# Altium footprint library Package_DFN_QFN.PcbLib: 557 footprints (part 6 of 35)
Each footprint in its own frame and in the unit in brackets; x right, y up, seen from the top. Pads: shape width x height; smd on the part's side, far side on the other; paste and mask are expansions set on the pad; w line width, h text height; cw(c..) or ccw(c..) is an arc to the next point about the centre after c.
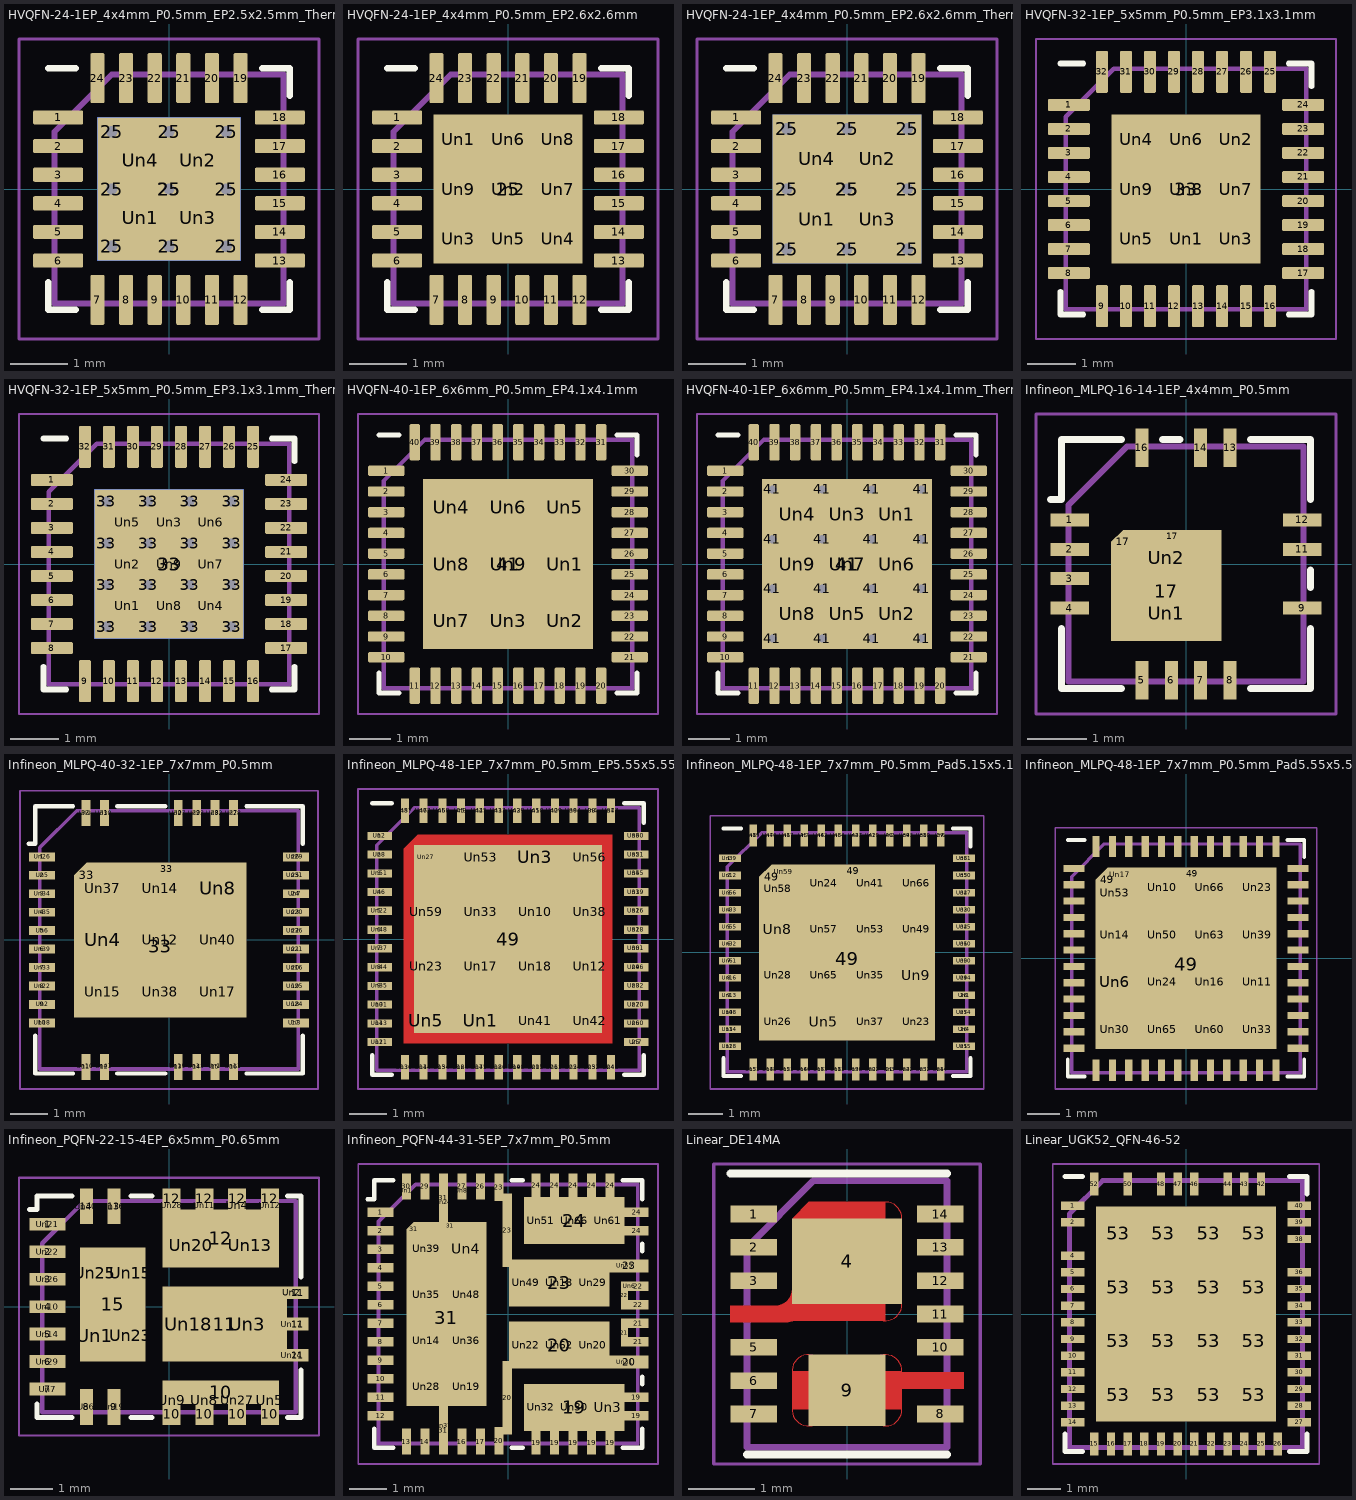
[diagram p5: the footprints below, top view; thin cyan lines are the x and y axes]

## HVQFN-24-1EP_4x4mm_P0.5mm_EP2.5x2.5mm_ThermalVias [mm]
pads (39):
  rrect25% 0.875x0.25 smd: 1(-1.937,1.25) 2(-1.937,0.75) 3(-1.937,0.25) 4(-1.937,-0.25) 5(-1.937,-0.75) 6(-1.937,-1.25) 13(1.937,-1.25) 14(1.937,-0.75) 15(1.937,-0.25) 16(1.937,0.25) 17(1.937,0.75) 18(1.937,1.25)
  rrect25% 0.25x0.875 smd: 7(-1.25,-1.937) 8(-0.75,-1.937) 9(-0.25,-1.937) 10(0.25,-1.937) 11(0.75,-1.937) 12(1.25,-1.937) 19(1.25,1.937) 20(0.75,1.937) 21(0.25,1.937) 22(-0.25,1.937) 23(-0.75,1.937) 24(-1.25,1.937)
  round 0.5 hole 0.2: 25(-1,-1) 25(-1,0) 25(-1,1) 25(0,-1) 25(0,0) 25(0,1) 25(1,-1) 25(1,0) 25(1,1)
  rect 2.5x2.5 smd far side: 25(0,0)
  rect 2.5x2.5 smd: 25(0,0)
  round 0.779 on Top Paste: Un1(-0.5,-0.5) Un2(0.5,0.5) Un3(0.5,-0.5) Un4(-0.5,0.5)
F.SilkS:
  lines w0.12: -2.11,-1.635 -2.11,-2.11 -1.635,-2.11 ; -2.11,2.11 -1.635,2.11 ; 1.635,-2.11 2.11,-2.11 2.11,-1.635 ; 1.635,2.11 2.11,2.11 2.11,1.635
F.Paste:
  region: -0.185,-0.308 -0.185,-0.692 -0.308,-0.815 -0.692,-0.815 -0.815,-0.692 -0.815,-0.308 -0.692,-0.185 -0.308,-0.185
  region: 0.815,0.692 0.815,0.308 0.692,0.185 0.308,0.185 0.185,0.308 0.185,0.692 0.308,0.815 0.692,0.815
  region: 0.815,-0.308 0.815,-0.692 0.692,-0.815 0.308,-0.815 0.185,-0.692 0.185,-0.308 0.308,-0.185 0.692,-0.185
  region: -0.185,0.692 -0.185,0.308 -0.308,0.185 -0.692,0.185 -0.815,0.308 -0.815,0.692 -0.692,0.815 -0.308,0.815
F.CrtYd:
  lines w0.05: -2.62,-2.62 2.62,-2.62 2.62,2.62 -2.62,2.62 -2.62,-2.62
F.Fab:
  lines w0.1: -2,-2 2,-2 2,2 -1,2 -2,1 -2,-2
  text "'.Designator'" at -4.047,-0.84 h1

## HVQFN-24-1EP_4x4mm_P0.5mm_EP2.6x2.6mm [mm]
pads (34):
  rrect25% 0.875x0.25 smd: 1(-1.937,1.25) 2(-1.937,0.75) 3(-1.937,0.25) 4(-1.937,-0.25) 5(-1.937,-0.75) 6(-1.937,-1.25) 13(1.937,-1.25) 14(1.937,-0.75) 15(1.937,-0.25) 16(1.937,0.25) 17(1.937,0.75) 18(1.937,1.25)
  rrect25% 0.25x0.875 smd: 7(-1.25,-1.937) 8(-0.75,-1.937) 9(-0.25,-1.937) 10(0.25,-1.937) 11(0.75,-1.937) 12(1.25,-1.937) 19(1.25,1.937) 20(0.75,1.937) 21(0.25,1.937) 22(-0.25,1.937) 23(-0.75,1.937) 24(-1.25,1.937)
  rect 2.6x2.6 smd: 25(0,0)
  rrect25% 0.7x0.7 on Top Paste: Un1(-0.87,0.87) Un2(0,0) Un3(-0.87,-0.87) Un4(0.87,-0.87) Un5(0,-0.87) Un6(0,0.87) Un7(0.87,0) Un8(0.87,0.87) Un9(-0.87,0)
F.SilkS:
  lines w0.12: -2.11,-1.635 -2.11,-2.11 -1.635,-2.11 ; -2.11,2.11 -1.635,2.11 ; 1.635,-2.11 2.11,-2.11 2.11,-1.635 ; 1.635,2.11 2.11,2.11 2.11,1.635
F.CrtYd:
  lines w0.05: -2.62,-2.62 2.62,-2.62 2.62,2.62 -2.62,2.62 -2.62,-2.62
F.Fab:
  lines w0.1: -2,-2 2,-2 2,2 -1,2 -2,1 -2,-2
  text "'.Designator'" at -4.047,-0.84 h1

## HVQFN-24-1EP_4x4mm_P0.5mm_EP2.6x2.6mm_ThermalVias [mm]
pads (39):
  rrect25% 0.875x0.25 smd: 1(-1.937,1.25) 2(-1.937,0.75) 3(-1.937,0.25) 4(-1.937,-0.25) 5(-1.937,-0.75) 6(-1.937,-1.25) 13(1.937,-1.25) 14(1.937,-0.75) 15(1.937,-0.25) 16(1.937,0.25) 17(1.937,0.75) 18(1.937,1.25)
  rrect25% 0.25x0.875 smd: 7(-1.25,-1.937) 8(-0.75,-1.937) 9(-0.25,-1.937) 10(0.25,-1.937) 11(0.75,-1.937) 12(1.25,-1.937) 19(1.25,1.937) 20(0.75,1.937) 21(0.25,1.937) 22(-0.25,1.937) 23(-0.75,1.937) 24(-1.25,1.937)
  round 0.5 hole 0.2: 25(-1.05,-1.05) 25(-1.05,0) 25(-1.05,1.05) 25(0,-1.05) 25(0,0) 25(0,1.05) 25(1.05,-1.05) 25(1.05,0) 25(1.05,1.05)
  rect 2.6x2.6 smd: 25(0,0)
  rect 2.6x2.6 smd far side: 25(0,0)
  round 0.825 on Top Paste: Un1(-0.525,-0.525) Un2(0.525,0.525) Un3(0.525,-0.525) Un4(-0.525,0.525)
F.SilkS:
  lines w0.12: -2.11,-1.635 -2.11,-2.11 -1.635,-2.11 ; -2.11,2.11 -1.635,2.11 ; 1.635,-2.11 2.11,-2.11 2.11,-1.635 ; 1.635,2.11 2.11,2.11 2.11,1.635
F.Paste:
  region: -0.182,-0.298 -0.182,-0.752 -0.298,-0.868 -0.752,-0.868 -0.868,-0.752 -0.868,-0.298 -0.752,-0.182 -0.298,-0.182
  region: 0.868,0.752 0.868,0.298 0.752,0.182 0.298,0.182 0.182,0.298 0.182,0.752 0.298,0.868 0.752,0.868
  region: 0.868,-0.298 0.868,-0.752 0.752,-0.868 0.298,-0.868 0.182,-0.752 0.182,-0.298 0.298,-0.182 0.752,-0.182
  region: -0.182,0.752 -0.182,0.298 -0.298,0.182 -0.752,0.182 -0.868,0.298 -0.868,0.752 -0.752,0.868 -0.298,0.868
F.CrtYd:
  lines w0.05: -2.62,-2.62 -2.62,2.62 2.62,2.62 2.62,-2.62 -2.62,-2.62
F.Fab:
  lines w0.1: -2,-2 2,-2 2,2 -1,2 -2,1 -2,-2
  text "'.Designator'" at -4.047,-0.84 h1

## HVQFN-32-1EP_5x5mm_P0.5mm_EP3.1x3.1mm [mm]
pads (42):
  rrect25% 0.875x0.25 smd: 1(-2.438,1.75) 2(-2.438,1.25) 3(-2.438,0.75) 4(-2.438,0.25) 5(-2.438,-0.25) 6(-2.438,-0.75) 7(-2.438,-1.25) 8(-2.438,-1.75) 17(2.438,-1.75) 18(2.438,-1.25) 19(2.438,-0.75) 20(2.438,-0.25) 21(2.438,0.25) 22(2.438,0.75) 23(2.438,1.25) 24(2.438,1.75)
  rrect25% 0.25x0.875 smd: 9(-1.75,-2.438) 10(-1.25,-2.438) 11(-0.75,-2.438) 12(-0.25,-2.438) 13(0.25,-2.438) 14(0.75,-2.438) 15(1.25,-2.438) 16(1.75,-2.438) 25(1.75,2.438) 26(1.25,2.438) 27(0.75,2.438) 28(0.25,2.438) 29(-0.25,2.438) 30(-0.75,2.438) 31(-1.25,2.438) 32(-1.75,2.438)
  rect 3.1x3.1 smd: 33(0,0)
  rrect25% 0.83x0.83 on Top Paste: Un1(0,-1.03) Un2(1.03,1.03) Un3(1.03,-1.03) Un4(-1.03,1.03) Un5(-1.03,-1.03) Un6(0,1.03) Un7(1.03,0) Un8(0,0) Un9(-1.03,0)
F.SilkS:
  lines w0.12: -2.61,-2.135 -2.61,-2.61 -2.135,-2.61 ; -2.61,2.61 -2.135,2.61 ; 2.135,-2.61 2.61,-2.61 2.61,-2.135 ; 2.135,2.61 2.61,2.61 2.61,2.135
F.CrtYd:
  lines w0.05: -3.12,-3.12 3.12,-3.12 3.12,3.12 -3.12,3.12 -3.12,-3.12
F.Fab:
  lines w0.1: -2.5,-2.5 2.5,-2.5 2.5,2.5 -1.5,2.5 -2.5,1.5 -2.5,-2.5
  text "'.Designator'" at -4.047,-0.84 h1

## HVQFN-32-1EP_5x5mm_P0.5mm_EP3.1x3.1mm_ThermalVias [mm]
pads (59):
  rrect25% 0.875x0.25 smd: 1(-2.438,1.75) 2(-2.438,1.25) 3(-2.438,0.75) 4(-2.438,0.25) 5(-2.438,-0.25) 6(-2.438,-0.75) 7(-2.438,-1.25) 8(-2.438,-1.75) 17(2.438,-1.75) 18(2.438,-1.25) 19(2.438,-0.75) 20(2.438,-0.25) 21(2.438,0.25) 22(2.438,0.75) 23(2.438,1.25) 24(2.438,1.75)
  rrect25% 0.25x0.875 smd: 9(-1.75,-2.438) 10(-1.25,-2.438) 11(-0.75,-2.438) 12(-0.25,-2.438) 13(0.25,-2.438) 14(0.75,-2.438) 15(1.25,-2.438) 16(1.75,-2.438) 25(1.75,2.438) 26(1.25,2.438) 27(0.75,2.438) 28(0.25,2.438) 29(-0.25,2.438) 30(-0.75,2.438) 31(-1.25,2.438) 32(-1.75,2.438)
  round 0.5 hole 0.2: 33(-1.3,-1.3) 33(-1.3,-0.433) 33(-1.3,0.433) 33(-1.3,1.3) 33(-0.433,-1.3) 33(-0.433,-0.433) 33(-0.433,0.433) 33(-0.433,1.3) 33(0.433,-1.3) 33(0.433,-0.433) 33(0.433,0.433) 33(0.433,1.3) 33(1.3,-1.3) 33(1.3,-0.433) 33(1.3,0.433) 33(1.3,1.3)
  rect 3.1x3.1 smd far side: 33(0,0)
  rect 3.1x3.1 smd: 33(0,0)
  round 0.637 on Top Paste: Un1(-0.867,-0.867) Un2(-0.867,0) Un3(0,0.867) Un4(0.867,-0.867) Un5(-0.867,0.867) Un6(0.867,0.867) Un7(0.867,0) Un8(0,-0.867) Un9(0,0)
F.SilkS:
  lines w0.12: -2.61,-2.135 -2.61,-2.61 -2.135,-2.61 ; -2.61,2.61 -2.135,2.61 ; 2.135,-2.61 2.61,-2.61 2.61,-2.135 ; 2.135,2.61 2.61,2.61 2.61,2.135
F.Paste:
  region: -0.613,-0.719 -0.613,-1.014 -0.719,-1.121 -1.014,-1.121 -1.121,-1.014 -1.121,-0.719 -1.014,-0.613 -0.719,-0.613
  region: -0.613,0.147 -0.613,-0.147 -0.719,-0.254 -1.014,-0.254 -1.121,-0.147 -1.121,0.147 -1.014,0.254 -0.719,0.254
  region: 0.254,1.014 0.254,0.719 0.147,0.613 -0.147,0.613 -0.254,0.719 -0.254,1.014 -0.147,1.121 0.147,1.121
  region: 1.121,-0.719 1.121,-1.014 1.014,-1.121 0.719,-1.121 0.613,-1.014 0.613,-0.719 0.719,-0.613 1.014,-0.613
  region: -0.613,1.014 -0.613,0.719 -0.719,0.613 -1.014,0.613 -1.121,0.719 -1.121,1.014 -1.014,1.121 -0.719,1.121
  region: 1.121,1.014 1.121,0.719 1.014,0.613 0.719,0.613 0.613,0.719 0.613,1.014 0.719,1.121 1.014,1.121
  region: 1.121,0.147 1.121,-0.147 1.014,-0.254 0.719,-0.254 0.613,-0.147 0.613,0.147 0.719,0.254 1.014,0.254
  region: 0.254,-0.719 0.254,-1.014 0.147,-1.121 -0.147,-1.121 -0.254,-1.014 -0.254,-0.719 -0.147,-0.613 0.147,-0.613
  region: 0.254,0.147 0.254,-0.147 0.147,-0.254 -0.147,-0.254 -0.254,-0.147 -0.254,0.147 -0.147,0.254 0.147,0.254
F.CrtYd:
  lines w0.05: -3.12,-3.12 3.12,-3.12 3.12,3.12 -3.12,3.12 -3.12,-3.12
F.Fab:
  lines w0.1: -2.5,-2.5 -2.5,1.5 -1.5,2.5 2.5,2.5 2.5,-2.5 -2.5,-2.5
  text "'.Designator'" at -4.047,-0.84 h1

## HVQFN-40-1EP_6x6mm_P0.5mm_EP4.1x4.1mm [mm]
pads (50):
  rrect25% 0.875x0.25 smd: 1(-2.937,2.25) 2(-2.937,1.75) 3(-2.937,1.25) 4(-2.937,0.75) 5(-2.937,0.25) 6(-2.937,-0.25) 7(-2.937,-0.75) 8(-2.937,-1.25) 9(-2.937,-1.75) 10(-2.937,-2.25) 21(2.937,-2.25) 22(2.937,-1.75) 23(2.937,-1.25) 24(2.937,-0.75) 25(2.937,-0.25) 26(2.937,0.25) 27(2.937,0.75) 28(2.937,1.25) 29(2.937,1.75) 30(2.937,2.25)
  rrect25% 0.25x0.875 smd: 11(-2.25,-2.937) 12(-1.75,-2.937) 13(-1.25,-2.937) 14(-0.75,-2.937) 15(-0.25,-2.937) 16(0.25,-2.937) 17(0.75,-2.937) 18(1.25,-2.937) 19(1.75,-2.937) 20(2.25,-2.937) 31(2.25,2.937) 32(1.75,2.937) 33(1.25,2.937) 34(0.75,2.937) 35(0.25,2.937) 36(-0.25,2.937) 37(-0.75,2.937) 38(-1.25,2.937) 39(-1.75,2.937) 40(-2.25,2.937)
  rect 4.1x4.1 smd: 41(0,0)
  rrect23% 1.1x1.1 on Top Paste: Un1(1.37,0) Un2(1.37,-1.37) Un3(0,-1.37) Un4(-1.37,1.37) Un5(1.37,1.37) Un6(0,1.37) Un7(-1.37,-1.37) Un8(-1.37,0) Un9(0,0)
F.SilkS:
  lines w0.12: -3.11,-2.635 -3.11,-3.11 -2.635,-3.11 ; -3.11,3.11 -2.635,3.11 ; 2.635,-3.11 3.11,-3.11 3.11,-2.635 ; 2.635,3.11 3.11,3.11 3.11,2.635
F.CrtYd:
  lines w0.05: -3.62,-3.62 -3.62,3.62 3.62,3.62 3.62,-3.62 -3.62,-3.62
F.Fab:
  lines w0.1: -3,-3 3,-3 3,3 -2,3 -3,2 -3,-3
  text "'.Designator'" at -4.047,-0.84 h1

## HVQFN-40-1EP_6x6mm_P0.5mm_EP4.1x4.1mm_ThermalVias [mm]
pads (67):
  rrect25% 0.875x0.25 smd: 1(-2.937,2.25) 2(-2.937,1.75) 3(-2.937,1.25) 4(-2.937,0.75) 5(-2.937,0.25) 6(-2.937,-0.25) 7(-2.937,-0.75) 8(-2.937,-1.25) 9(-2.937,-1.75) 10(-2.937,-2.25) 21(2.937,-2.25) 22(2.937,-1.75) 23(2.937,-1.25) 24(2.937,-0.75) 25(2.937,-0.25) 26(2.937,0.25) 27(2.937,0.75) 28(2.937,1.25) 29(2.937,1.75) 30(2.937,2.25)
  rrect25% 0.25x0.875 smd: 11(-2.25,-2.937) 12(-1.75,-2.937) 13(-1.25,-2.937) 14(-0.75,-2.937) 15(-0.25,-2.937) 16(0.25,-2.937) 17(0.75,-2.937) 18(1.25,-2.937) 19(1.75,-2.937) 20(2.25,-2.937) 31(2.25,2.937) 32(1.75,2.937) 33(1.25,2.937) 34(0.75,2.937) 35(0.25,2.937) 36(-0.25,2.937) 37(-0.75,2.937) 38(-1.25,2.937) 39(-1.75,2.937) 40(-2.25,2.937)
  round 0.5 hole 0.2: 41(-1.8,-1.8) 41(-1.8,-0.6) 41(-1.8,0.6) 41(-1.8,1.8) 41(-0.6,-1.8) 41(-0.6,-0.6) 41(-0.6,0.6) 41(-0.6,1.8) 41(0.6,-1.8) 41(0.6,-0.6) 41(0.6,0.6) 41(0.6,1.8) 41(1.8,-1.8) 41(1.8,-0.6) 41(1.8,0.6) 41(1.8,1.8)
  rect 4.1x4.1 smd: 41(0,0)
  rect 4.1x4.1 smd far side: 41(0,0)
  rrect24% 1.059x1.059 on Top Paste: Un1(1.2,1.2) Un2(1.2,-1.2) Un3(0,1.2) Un4(-1.2,1.2) Un5(0,-1.2) Un6(1.2,0) Un7(0,0) Un8(-1.2,-1.2) Un9(-1.2,0)
F.SilkS:
  lines w0.12: -3.11,-2.635 -3.11,-3.11 -2.635,-3.11 ; -3.11,3.11 -2.635,3.11 ; 2.635,-3.11 3.11,-3.11 3.11,-2.635 ; 2.635,3.11 3.11,3.11 3.11,2.635
F.CrtYd:
  lines w0.05: -3.62,-3.62 -3.62,3.62 3.62,3.62 3.62,-3.62 -3.62,-3.62
F.Fab:
  lines w0.1: -3,-3 3,-3 3,3 -2,3 -3,2 -3,-3
  text "'.Designator'" at -4.047,-0.84 h1

## Infineon_MLPQ-16-14-1EP_4x4mm_P0.5mm [mm]
pads (19):
  rect 0.65x0.22 smd: 1(-1.975,0.75) 2(-1.975,0.25) 3(-1.975,-0.25) 4(-1.975,-0.75) 9(1.975,-0.75) 11(1.975,0.25) 12(1.975,0.75)
  rect 0.22x0.65 smd: 5(-0.75,-1.975) 6(-0.25,-1.975) 7(0.25,-1.975) 8(0.75,-1.975) 13(0.75,1.975) 14(0.25,1.975) 16(-0.75,1.975)
  rect 0.283x0.283 smd rot 45: 17(-1.075,0.375)
  rect 1.88x1.68 smd: 17(-0.335,-0.465)
  rect 1.68x0.2 smd: 17(-0.235,0.475)
  rect 1.5x0.8 on Top Paste: Un1(-0.335,-0.835) Un2(-0.335,0.105)
F.SilkS:
  lines w0.12: -2.3,1.1 -2.12,1.1 -2.12,2.12 -1.1,2.12 ; -2.12,-1.1 -2.12,-2.12 -1.1,-2.12 ; -0.4,2.12 -0.1,2.12 ; 1.1,-2.12 2.12,-2.12 2.12,-1.1 ; 1.1,2.12 2.12,2.12 2.12,1.1 ; 2.12,-0.4 2.12,-0.1
F.CrtYd:
  lines w0.05: -2.55,-2.55 -2.55,2.55 2.55,2.55 2.55,-2.55 -2.55,-2.55
F.Fab:
  lines w0.1: -2,-2 2,-2 2,2 -1,2 -2,1 -2,-2
  text "'.Designator'" at -3.657,-0.771 h0.9

## Infineon_MLPQ-40-32-1EP_7x7mm_P0.5mm [mm]
pads (76):
  rect 0.7x0.24 smd: 1(-3.44,2.25) 2(-3.44,1.75) 3(-3.44,1.25) 4(-3.44,0.75) 5(-3.44,0.25) 6(-3.44,-0.25) 7(-3.44,-0.75) 8(-3.44,-1.25) 9(-3.44,-1.75) 10(-3.44,-2.25) 17(3.44,-2.25) 18(3.44,-1.75) 19(3.44,-1.25) 20(3.44,-0.75) 21(3.44,-0.25) 22(3.44,0.25) 23(3.44,0.75) 24(3.44,1.25) 25(3.44,1.75) 26(3.44,2.25)
  rect 0.24x0.7 smd: 11(-2.25,-3.44) 12(-1.75,-3.44) 13(0.25,-3.44) 14(0.75,-3.44) 15(1.25,-3.44) 16(1.75,-3.44) 27(1.75,3.44) 28(1.25,3.44) 29(0.75,3.44) 30(0.25,3.44) 31(-1.75,3.44) 32(-2.25,3.44)
  rect 0.495x0.495 smd rot 45: 33(-2.225,1.75)
  rect 4.675x3.85 smd: 33(-0.238,-0.175)
  rect 4.325x0.35 smd: 33(-0.062,1.925)
  rect 0.22x0.65 on Top Paste: Un1(1.25,-3.425) Un9(-2.25,3.425) Un10(-2.25,-3.425) Un11(1.75,-3.425) Un13(0.75,-3.425) Un19(0.25,-3.425) Un23(0.75,3.425) Un27(0.25,3.425) Un28(1.75,3.425) Un30(-1.75,3.425) Un32(1.25,3.425) Un41(-1.75,-3.425)
  rect 0.65x0.22 on Top Paste: Un2(-3.425,-1.75) Un3(3.425,-2.25) Un5(-3.425,1.75) Un6(-3.425,0.25) Un7(3.425,1.25) Un16(3.425,-0.75) Un18(-3.425,-2.25) Un20(3.425,0.75) Un21(3.425,-0.25) Un22(-3.425,-1.25) Un24(3.425,-1.75) Un25(3.425,-1.25) Un26(-3.425,2.25) Un29(3.425,2.25) Un31(3.425,1.75) Un33(-3.425,-0.75) Un34(-3.425,1.25) Un35(-3.425,0.75) Un36(3.425,0.25) Un39(-3.425,-0.25)
  rect 1.2x1.1 on Top Paste: Un4(-1.796,0) Un8(1.321,1.4) Un12(-0.238,0) Un14(-0.238,1.4) Un15(-1.796,-1.4) Un17(1.321,-1.4) Un37(-1.796,1.4) Un38(-0.238,-1.4) Un40(1.321,0)
F.SilkS:
  lines w0.12: -3.8,2.6 -3.62,2.6 -3.62,3.62 -2.6,3.62 ; -3.62,-2.6 -3.62,-3.62 -2.6,-3.62 ; -1.4,-3.62 -0.1,-3.62 ; -1.4,3.62 -0.1,3.62 ; 2.1,-3.62 3.62,-3.62 3.62,-2.6 ; 2.1,3.62 3.62,3.62 3.62,2.6
F.CrtYd:
  lines w0.05: -4.04,-4.04 4.04,-4.04 4.04,4.04 -4.04,4.04 -4.04,-4.04
F.Fab:
  lines w0.1: -3.5,-3.5 -3.5,2.5 -2.5,3.5 3.5,3.5 3.5,-3.5 -3.5,-3.5
  text "'.Designator'" at -4.047,-0.84 h1

## Infineon_MLPQ-48-1EP_7x7mm_P0.5mm_EP5.55x5.55mm [mm]
pads (113):
  rect 0.65x0.22 smd: 1(-3.425,2.75) 2(-3.425,2.25) 3(-3.425,1.75) 4(-3.425,1.25) 5(-3.425,0.75) 6(-3.425,0.25) 7(-3.425,-0.25) 8(-3.425,-0.75) 9(-3.425,-1.25) 10(-3.425,-1.75) 11(-3.425,-2.25) 12(-3.425,-2.75) 25(3.425,-2.75) 26(3.425,-2.25) 27(3.425,-1.75) 28(3.425,-1.25) 29(3.425,-0.75) 30(3.425,-0.25) 31(3.425,0.25) 32(3.425,0.75) 33(3.425,1.25) 34(3.425,1.75) 35(3.425,2.25) 36(3.425,2.75)
  rect 0.22x0.65 smd: 13(-2.75,-3.425) 14(-2.25,-3.425) 15(-1.75,-3.425) 16(-1.25,-3.425) 17(-0.75,-3.425) 18(-0.25,-3.425) 19(0.25,-3.425) 20(0.75,-3.425) 21(1.25,-3.425) 22(1.75,-3.425) 23(2.25,-3.425) 24(2.75,-3.425) 37(2.75,3.425) 38(2.25,3.425) 39(1.75,3.425) 40(1.25,3.425) 41(0.75,3.425) 42(0.25,3.425) 43(-0.25,3.425) 44(-0.75,3.425) 45(-1.25,3.425) 46(-1.75,3.425) 47(-2.25,3.425) 48(-2.75,3.425)
  rect 5x5 smd: 49(0,0)
  rect 1.1x1.1 on Top Paste: Un1(-0.725,-2.175) Un3(0.725,2.175) Un5(-2.175,-2.175) Un10(0.725,0.725) Un12(2.175,-0.725) Un17(-0.725,-0.725) Un18(0.725,-0.725) Un23(-2.175,-0.725) Un33(-0.725,0.725) Un38(2.175,0.725) Un41(0.725,-2.175) Un42(2.175,-2.175) Un53(-0.725,2.175) Un56(2.175,2.175) Un59(-2.175,0.725)
  rect 0.55x0.22 on Top Paste: Un2(-3.425,2.75) Un6(-3.425,1.25) Un7(3.425,-2.75) Un8(-3.425,2.25) Un11(-3.425,-2.75) Un16(3.425,0.75) Un19(3.425,1.25) Un20(3.425,-1.75) Un21(3.425,2.25) Un22(-3.425,0.75) Un28(3.425,0.25) Un30(3.425,2.75) Un31(-3.425,-1.75) Un32(3.425,-1.25) Un35(-3.425,-1.25) Un37(-3.425,-0.25) Un43(-3.425,-2.25) Un44(-3.425,-0.75) Un46(3.425,-0.75) Un48(-3.425,0.25) Un51(-3.425,1.75) Un55(3.425,1.75) Un60(3.425,-2.25) Un61(3.425,-0.25)
  rect 0.22x0.55 on Top Paste: Un4(2.25,3.425) Un9(-1.25,3.425) Un13(-0.25,3.425) Un14(-2.25,-3.425) Un15(0.75,-3.425) Un24(-1.25,-3.425) Un25(-0.75,3.425) Un26(-0.25,-3.425) Un29(1.25,3.425) Un34(-1.75,-3.425) Un36(-2.75,-3.425) Un39(0.25,3.425) Un40(0.25,-3.425) Un45(-0.75,-3.425) Un47(2.75,3.425) Un49(2.75,-3.425) Un50(0.75,3.425) Un52(2.25,-3.425) Un54(1.75,-3.425) Un57(-2.75,3.425) Un58(-1.75,3.425) Un62(-2.25,3.425) Un63(1.25,-3.425) Un64(1.75,3.425)
  rect 0.5x0.5 on Top Paste: Un27(-2.175,2.175)
F.Cu:
  region: 2.775,-2.775 -2.775,-2.775 -2.775,2.407 -2.407,2.775 2.775,2.775
F.SilkS:
  lines w0.12: -3.62,-3.1 -3.62,-3.62 -3.1,-3.62 ; -3.62,3.62 -3.1,3.62 ; 3.1,-3.62 3.62,-3.62 3.62,-3.1 ; 3.1,3.62 3.62,3.62 3.62,3.1
F.Paste:
  region: -1.625,1.625 -2.725,1.625 -2.725,2.386 -2.386,2.725 -1.625,2.725
F.Mask:
  region: 2.775,-2.775 -2.775,-2.775 -2.775,2.407 -2.407,2.775 2.775,2.775
F.CrtYd:
  lines w0.05: -4,-4 4,-4 4,4 -4,4 -4,-4
F.Fab:
  lines w0.1: -3.5,-3.5 -3.5,2.5 -2.5,3.5 3.5,3.5 3.5,-3.5 -3.5,-3.5
  text "'.Designator'" at -4.047,-0.84 h1

## Infineon_MLPQ-48-1EP_7x7mm_P0.5mm_Pad5.15x5.15mm [mm]
pads (117):
  rect 0.65x0.22 smd: 1(-3.425,2.75) 2(-3.425,2.25) 3(-3.425,1.75) 4(-3.425,1.25) 5(-3.425,0.75) 6(-3.425,0.25) 7(-3.425,-0.25) 8(-3.425,-0.75) 9(-3.425,-1.25) 10(-3.425,-1.75) 11(-3.425,-2.25) 12(-3.425,-2.75) 25(3.425,-2.75) 26(3.425,-2.25) 27(3.425,-1.75) 28(3.425,-1.25) 29(3.425,-0.75) 30(3.425,-0.25) 31(3.425,0.25) 32(3.425,0.75) 33(3.425,1.25) 34(3.425,1.75) 35(3.425,2.25) 36(3.425,2.75)
  rect 0.22x0.65 smd: 13(-2.75,-3.425) 14(-2.25,-3.425) 15(-1.75,-3.425) 16(-1.25,-3.425) 17(-0.75,-3.425) 18(-0.25,-3.425) 19(0.25,-3.425) 20(0.75,-3.425) 21(1.25,-3.425) 22(1.75,-3.425) 23(2.25,-3.425) 24(2.75,-3.425) 37(2.75,3.425) 38(2.25,3.425) 39(1.75,3.425) 40(1.25,3.425) 41(0.75,3.425) 42(0.25,3.425) 43(-0.25,3.425) 44(-0.75,3.425) 45(-1.25,3.425) 46(-1.75,3.425) 47(-2.25,3.425) 48(-2.75,3.425)
  rect 0.52x0.52 smd rot 45: 49(-2.207,2.207)
  rect 5.15x4.782 smd: 49(0,-0.184)
  rect 4.782x0.368 smd: 49(0.184,2.391)
  rect 0.55x0.22 on Top Paste: Un1(3.425,-1.25) Un4(3.425,-2.25) Un12(-3.425,2.25) Un13(-3.425,-1.25) Un15(3.425,-2.75) Un16(-3.425,-0.75) Un18(-3.425,-2.75) Un20(3.425,1.25) Un27(3.425,1.75) Un30(3.425,2.25) Un31(3.425,2.75) Un32(-3.425,0.25) Un33(-3.425,1.25) Un34(-3.425,-2.25) Un39(-3.425,2.75) Un44(3.425,-0.75) Un45(3.425,0.75) Un48(-3.425,-1.75) Un50(3.425,-0.25) Un54(3.425,-1.75) Un55(-3.425,0.75) Un56(-3.425,1.75) Un60(3.425,0.25) Un61(-3.425,-0.25)
  rect 0.22x0.55 on Top Paste: Un2(1.25,3.425) Un3(1.25,-3.425) Un6(2.75,3.425) Un7(-1.25,3.425) Un10(2.25,3.425) Un11(-0.25,-3.425) Un14(2.75,-3.425) Un17(-1.75,3.425) Un19(-2.75,3.425) Un21(-1.75,-3.425) Un22(0.75,-3.425) Un29(0.75,3.425) Un36(0.25,-3.425) Un38(-2.25,-3.425) Un40(-1.25,-3.425) Un42(1.75,-3.425) Un43(1.75,3.425) Un46(-2.25,3.425) Un47(0.25,3.425) Un51(-2.75,-3.425) Un52(2.25,-3.425) Un62(-0.75,3.425) Un63(-0.75,-3.425) Un64(-0.25,3.425)
  rect 1x1 on Top Paste: Un5(-0.675,-2.025) Un8(-2.025,0.675) Un9(2.025,-0.675) Un23(2.025,-2.025) Un24(-0.675,2.025) Un26(-2.025,-2.025) Un28(-2.025,-0.675) Un35(0.675,-0.675) Un37(0.675,-2.025) Un41(0.675,2.025) Un49(2.025,0.675) Un53(0.675,0.675) Un57(-0.675,0.675) Un65(-0.675,-0.675) Un66(2.025,2.025)
  rect 0.479x0.479 on Top Paste rot 45: Un25(-2.186,2.186)
  rect 1x0.661 on Top Paste: Un58(-2.025,1.856)
  rect 0.661x0.339 on Top Paste: Un59(-1.856,2.355)
F.SilkS:
  lines w0.12: -3.62,-3.1 -3.62,-3.62 -3.1,-3.62 ; -3.62,3.62 -3.1,3.62 ; 3.1,-3.62 3.62,-3.62 3.62,-3.1 ; 3.1,3.62 3.62,3.62 3.62,3.1
F.CrtYd:
  lines w0.05: -4,-4 4,-4 4,4 -4,4 -4,-4
F.Fab:
  lines w0.1: -3.5,-3.5 3.5,-3.5 3.5,3.5 -2.5,3.5 -3.5,2.5 -3.5,-3.5
  text "'.Designator'" at -4.047,-0.84 h1

## Infineon_MLPQ-48-1EP_7x7mm_P0.5mm_Pad5.55x5.55mm [mm]
pads (117):
  rect 0.65x0.22 smd: 1(-3.425,2.75) 2(-3.425,2.25) 3(-3.425,1.75) 4(-3.425,1.25) 5(-3.425,0.75) 6(-3.425,0.25) 7(-3.425,-0.25) 8(-3.425,-0.75) 9(-3.425,-1.25) 10(-3.425,-1.75) 11(-3.425,-2.25) 12(-3.425,-2.75) 25(3.425,-2.75) 26(3.425,-2.25) 27(3.425,-1.75) 28(3.425,-1.25) 29(3.425,-0.75) 30(3.425,-0.25) 31(3.425,0.25) 32(3.425,0.75) 33(3.425,1.25) 34(3.425,1.75) 35(3.425,2.25) 36(3.425,2.75)
  rect 0.22x0.65 smd: 13(-2.75,-3.425) 14(-2.25,-3.425) 15(-1.75,-3.425) 16(-1.25,-3.425) 17(-0.75,-3.425) 18(-0.25,-3.425) 19(0.25,-3.425) 20(0.75,-3.425) 21(1.25,-3.425) 22(1.75,-3.425) 23(2.25,-3.425) 24(2.75,-3.425) 37(2.75,3.425) 38(2.25,3.425) 39(1.75,3.425) 40(1.25,3.425) 41(0.75,3.425) 42(0.25,3.425) 43(-0.25,3.425) 44(-0.75,3.425) 45(-1.25,3.425) 46(-1.75,3.425) 47(-2.25,3.425) 48(-2.75,3.425)
  rect 0.52x0.52 smd rot 45: 49(-2.407,2.407)
  rect 5.55x5.182 smd: 49(0,-0.184)
  rect 5.182x0.368 smd: 49(0.184,2.591)
  rect 0.55x0.22 on Top Paste: Un1(3.425,-1.25) Un2(3.425,1.25) Un4(-3.425,1.25) Un9(3.425,-1.75) Un13(-3.425,2.75) Un19(-3.425,2.25) Un20(-3.425,-0.25) Un21(3.425,1.75) Un25(3.425,2.25) Un28(3.425,-0.75) Un32(3.425,-0.25) Un34(3.425,-2.25) Un35(-3.425,-1.75) Un37(-3.425,-1.25) Un38(3.425,0.25) Un40(3.425,2.75) Un41(-3.425,1.75) Un42(-3.425,-0.75) Un43(-3.425,0.75) Un47(-3.425,0.25) Un54(3.425,-2.75) Un56(3.425,0.75) Un57(-3.425,-2.25) Un59(-3.425,-2.75)
  rect 0.22x0.55 on Top Paste: Un3(-2.25,-3.425) Un5(-2.75,3.425) Un7(-1.75,-3.425) Un8(1.25,-3.425) Un12(2.25,-3.425) Un15(-2.25,3.425) Un18(-0.75,3.425) Un22(1.75,3.425) Un26(0.25,3.425) Un27(-2.75,-3.425) Un29(-1.75,3.425) Un31(1.25,3.425) Un36(2.75,3.425) Un44(0.75,-3.425) Un45(2.75,-3.425) Un46(-0.25,-3.425) Un49(0.25,-3.425) Un51(-0.25,3.425) Un52(-1.25,-3.425) Un55(-1.25,3.425) Un58(2.25,3.425) Un61(0.75,3.425) Un62(-0.75,-3.425) Un64(1.75,-3.425)
  rect 1.1x1.1 on Top Paste: Un6(-2.175,-0.725) Un10(-0.725,2.175) Un11(2.175,-0.725) Un14(-2.175,0.725) Un16(0.725,-0.725) Un23(2.175,2.175) Un24(-0.725,-0.725) Un30(-2.175,-2.175) Un33(2.175,-2.175) Un39(2.175,0.725) Un50(-0.725,0.725) Un60(0.725,-2.175) Un63(0.725,0.725) Un65(-0.725,-2.175) Un66(0.725,2.175)
  rect 0.761x0.339 on Top Paste: Un17(-2.006,2.555)
  rect 0.479x0.479 on Top Paste rot 45: Un48(-2.386,2.386)
  rect 1.1x0.761 on Top Paste: Un53(-2.175,2.006)
F.SilkS:
  lines w0.12: -3.62,-3.1 -3.62,-3.62 -3.1,-3.62 ; -3.62,3.62 -3.1,3.62 ; 3.1,-3.62 3.62,-3.62 3.62,-3.1 ; 3.1,3.62 3.62,3.62 3.62,3.1
F.CrtYd:
  lines w0.05: -4,-4 -4,4 4,4 4,-4 -4,-4
F.Fab:
  lines w0.1: -3.5,-3.5 3.5,-3.5 3.5,3.5 -2.5,3.5 -3.5,2.5 -3.5,-3.5
  text "'.Designator'" at -4.047,-0.84 h1

## Infineon_PQFN-22-15-4EP_6x5mm_P0.65mm [mm]
pads (56):
  rect 0.85x0.3 smd: 1(-2.873,1.95) 2(-2.873,1.3) 3(-2.873,0.65) 4(-2.873,0) 5(-2.873,-0.65) 6(-2.873,-1.3) 7(-2.873,-1.95)
  rect 0.3x0.85 smd: 8(-1.953,-2.375) 9(-1.302,-2.375) 13(-1.302,2.375) 14(-1.953,2.375)
  rect 0.425x0.5 smd: 10(0.062,-2.55) 10(0.837,-2.55) 10(1.613,-2.55) 10(2.388,-2.55) 12(0.061,2.55) 12(0.835,2.55) 12(1.61,2.55) 12(2.385,2.55)
  rect 2.75x0.55 smd: 10(1.225,-2.025)
  rect 2.95x1.775 smd: 11(1.322,-0.413)
  rect 0.5x0.299 smd: 11(3.047,-1.15) 11(3.047,0.325)
  rect 0.5x0.3 smd: 11(3.047,-0.413)
  rect 2.75x1.375 smd: 12(1.223,1.613)
  rect 1.55x2.7 smd: 15(-1.331,0.05)
  rect 0.7x1.22 on Top Paste: Un1(-1.753,-0.695) Un15(-0.903,0.795) Un23(-0.903,-0.695) Un25(-1.753,0.795)
  rect 0.625x0.29 on Top Paste: Un2(2.907,0.327) Un17(2.907,-0.413) Un24(2.907,-1.152)
  rect 1.24x1.78 on Top Paste: Un3(1.847,-0.413) Un18(0.467,-0.413)
  rect 0.425x0.625 on Top Paste: Un4(1.61,2.4) Un11(0.835,2.4) Un12(2.385,2.4) Un28(0.061,2.4)
  rect 0.425x0.95 on Top Paste: Un5(2.388,-2.221) Un8(0.837,-2.221) Un9(0.062,-2.221) Un27(1.613,-2.221)
  rect 0.27x0.8 on Top Paste: Un6(-1.953,-2.37) Un16(-1.302,2.37) Un19(-1.302,-2.37) Un30(-1.953,2.37)
  rect 0.8x0.27 on Top Paste: Un7(-2.873,-1.95) Un10(-2.873,0) Un14(-2.873,-0.65) Un21(-2.873,1.95) Un22(-2.873,1.3) Un26(-2.873,0.65) Un29(-2.873,-1.3)
  rect 1.25x0.96 on Top Paste: Un13(1.927,1.45) Un20(0.527,1.45)
F.SilkS:
  lines w0.12: -3.3,2.3 -3.12,2.3 -3.12,2.62 -2.3,2.62 ; -3.12,-2.3 -3.12,-2.62 -2.3,-2.62 ; -0.9,-2.62 -0.4,-2.62 ; -0.9,2.62 -0.4,2.62 ; 2.8,-2.62 3.12,-2.62 3.12,-1.5 ; 2.8,2.62 3.12,2.62 3.12,0.7
F.CrtYd:
  lines w0.05: -3.55,-3.05 -3.55,3.05 3.55,3.05 3.55,-3.05 -3.55,-3.05
F.Fab:
  lines w0.1: -3,-2.5 -3,1.5 -2,2.5 3,2.5 3,-2.5 -3,-2.5
  text "'.Designator'" at -4.047,-0.84 h1

## Infineon_PQFN-44-31-5EP_7x7mm_P0.5mm [mm]
pads (125):
  rect 0.7x0.25 smd: 1(-3.447,2.75) 2(-3.447,2.25) 3(-3.447,1.75) 4(-3.447,1.25) 5(-3.447,0.75) 6(-3.447,0.25) 7(-3.447,-0.25) 8(-3.447,-0.75) 9(-3.447,-1.25) 10(-3.447,-1.75) 11(-3.447,-2.25) 12(-3.447,-2.75)
  rect 0.25x0.7 smd: 13(-2.746,-3.45) 14(-2.247,-3.45) 16(-1.246,-3.45) 17(-0.747,-3.45) 26(-0.747,3.45) 27(-1.246,3.45) 29(-2.247,3.45) 30(-2.746,3.45)
  rect 0.25x0.645 smd: 19(0.754,-3.477) 19(1.254,-3.477) 19(1.753,-3.477) 19(2.254,-3.477) 19(2.753,-3.477) 24(0.754,3.477) 24(1.254,3.477) 24(1.753,3.477) 24(2.254,3.477) 24(2.753,3.477)
  rect 2.72x1.27 smd: 19(1.783,-2.52) 20(1.383,-0.84) 23(1.383,0.84) 24(1.786,2.52)
  rect 0.65x0.25 smd: 19(3.468,-2.75) 19(3.468,-2.25) 24(3.471,2.25) 24(3.471,2.75)
  rect 0.25x0.75 smd: 20(-0.246,-3.425) 23(-0.246,3.425)
  rect 0.25x1.98 smd: 20(-0.026,-2.26) 23(-0.026,2.26)
  rect 1.05x0.35 smd: 20(3.268,-1.3) 23(3.268,1.3)
  rect 0.2x0.75 smd: 21(3.143,-0.5) 22(3.143,0.5)
  rect 0.55x0.25 smd: 21(3.518,-0.75) 21(3.518,-0.25) 22(3.518,0.25) 22(3.518,0.75)
  rect 0.283x0.283 smd rot 45: 31(-2.546,2.29)
  rect 0.25x1.31 smd: 31(-1.746,-3.145) 31(-1.746,3.145)
  rect 2.16x4.78 smd: 31(-1.666,-0.1)
  rect 1.96x0.2 smd: 31(-1.566,2.39)
  rect 0.22x0.39 on Top Paste: Un1(-2.746,3.325) Un8(-1.246,3.325) Un11(-2.247,3.325) Un13(-2.247,-3.325) Un16(-2.746,-3.325) Un17(-0.747,3.325) Un42(-0.747,-3.325) Un46(-1.246,-3.325)
  rect 0.21x0.34 on Top Paste: Un2(-0.026,3.07) Un5(-0.026,1.67) Un10(-0.026,-3.07) Un43(-0.026,-2.37) Un45(-0.026,2.37) Un63(-0.026,-1.67)
  rect 0.65x0.9 on Top Paste: Un3(2.696,-2.515) Un30(1.786,-2.515) Un32(0.877,-2.515) Un51(0.877,2.515) Un61(2.696,2.515) Un66(1.786,2.515)
  rect 0.77x0.93 on Top Paste: Un4(-1.127,1.76) Un14(-2.207,-0.72) Un19(-1.127,-1.96) Un28(-2.207,-1.96) Un35(-2.207,0.52) Un36(-1.127,-0.72) Un39(-2.207,1.76) Un48(-1.127,0.52)
  rect 0.44x0.22 on Top Paste: Un6(3.284,0.75) Un64(3.284,-0.25) Un69(3.284,0.25) Un70(3.284,-0.75)
  rect 0.22x0.35 on Top Paste: Un7(1.753,3.325) Un15(1.753,-3.325) Un27(2.753,-3.325) Un33(2.254,3.325) Un50(1.254,3.325) Un52(0.754,-3.325) Un53(1.254,-3.325) Un60(0.754,3.325) Un65(2.254,-3.325) Un68(2.753,3.325)
  rect 0.28x0.22 on Top Paste: Un9(3.364,2.25) Un12(3.364,-2.25) Un47(3.364,2.75) Un67(3.364,-2.75)
  rect 0.68x0.9 on Top Paste: Un18(1.383,0.84) Un20(2.294,-0.84) Un22(0.473,-0.84) Un29(2.294,0.84) Un49(0.473,0.84) Un62(1.383,-0.84)
  rect 0.39x0.22 on Top Paste: Un21(-3.321,-2.25) Un23(-3.321,-0.75) Un25(-3.321,-0.25) Un34(-3.321,-2.75) Un38(-3.321,0.75) Un40(-3.321,0.25) Un41(-3.321,1.25) Un44(-3.321,-1.25) Un54(-3.321,2.75) Un56(-3.321,2.25) Un57(-3.321,1.75) Un58(-3.321,-1.75)
  rect 0.23x1.01 on Top Paste: Un24(-1.746,3.015) Un37(-1.746,-3.015)
  rect 0.23x0.44 on Top Paste: Un26(-0.246,3.28) Un59(-0.246,-3.28)
  rect 0.68x0.22 on Top Paste: Un31(3.163,-1.3) Un55(3.163,1.3)
F.SilkS:
  lines w0.12: -3.8,3.1 -3.62,3.1 -3.62,3.62 -3.1,3.62 ; -3.62,-3.1 -3.62,-3.62 -3.1,-3.62 ; 0.1,-3.62 0.4,-3.62 ; 0.1,3.62 0.4,3.62 ; 3.1,-3.62 3.62,-3.62 3.62,-3.1 ; 3.1,3.62 3.62,3.62 3.62,3.1 ; 3.62,-1.9 3.62,-1.7 ; 3.62,1.7 3.62,1.9
F.CrtYd:
  lines w0.05: -4.05,-4.05 4.05,-4.05 4.05,4.05 -4.05,4.05 -4.05,-4.05
F.Fab:
  lines w0.1: -3.5,-3.5 3.5,-3.5 3.5,3.5 -2.5,3.5 -3.5,2.5 -3.5,-3.5
  text "'.Designator'" at -4.047,-0.84 h1

## Linear_DE14MA [mm]
pads (14):
  rect 0.7x0.25 smd: 1(-1.4,1.5) 2(-1.4,1) 3(-1.4,0.5) 5(-1.4,-0.5) 6(-1.4,-1) 7(-1.4,-1.5) 8(1.4,-1.5) 10(1.4,-0.5) 11(1.4,0) 12(1.4,0.5) 13(1.4,1) 14(1.4,1.5)
  rect 1.65x1.28 smd: 4(0,0.79)
  rect 1.15x1.07 smd: 9(0,-1.145)
F.Cu:
  circle w0: c0.575,1.43 r0.25
  circle w0: c0.575,0.15 r0.25
  region: 0.575,-0.1 -0.825,-0.1 -0.825,1.43 -0.575,1.68 0.575,1.68
  region: -0.78,-0.1 -0.88,-0.125 -1.75,-0.125 -1.75,0.125 -0.78,0.125
  region: -0.825,0.125 -1.075,0.125 -1.025,0.13 -0.977,0.145 -0.935,0.168 -0.897,0.199 -0.866,0.238 -0.844,0.279 -0.83,0.326 -0.825,0.375
  circle w0: c-0.575,-0.86 r0.25
  circle w0: c0.575,-0.86 r0.25
  circle w0: c-0.575,-1.43 r0.25
  circle w0: c0.575,-1.43 r0.25
  region: 0.825,-1.43 -0.825,-1.43 -0.825,-0.86 0.825,-0.86
  region: 1.75,-1.125 0.825,-1.125 0.825,-0.875 1.75,-0.875
F.SilkS:
  lines w0.12: -1.75,2.11 1.5,2.11 ; -1.5,-2.11 1.5,-2.11
F.Paste:
  circle w0: c0.575,1.43 r0.25
  circle w0: c0.575,0.15 r0.25
  region: 0.575,-0.1 -0.825,-0.1 -0.825,1.43 -0.575,1.68 0.575,1.68
  region: -0.78,-0.1 -0.88,-0.125 -1.75,-0.125 -1.75,0.125 -0.78,0.125
  region: -0.825,0.125 -1.075,0.125 -1.025,0.13 -0.977,0.145 -0.935,0.168 -0.897,0.199 -0.866,0.238 -0.844,0.279 -0.83,0.326 -0.825,0.375
  circle w0: c-0.575,-0.86 r0.25
  circle w0: c0.575,-0.86 r0.25
  circle w0: c-0.575,-1.43 r0.25
  circle w0: c0.575,-1.43 r0.25
  region: 0.825,-1.43 -0.825,-1.43 -0.825,-0.86 0.825,-0.86
  region: 1.75,-1.125 0.825,-1.125 0.825,-0.875 1.75,-0.875
F.Mask:
  circle w0: c0.575,1.43 r0.25
  circle w0: c0.575,0.15 r0.25
  region: 0.575,-0.1 -0.825,-0.1 -0.825,1.43 -0.575,1.68 0.575,1.68
  region: -0.78,-0.1 -0.88,-0.125 -1.75,-0.125 -1.75,0.125 -0.78,0.125
  region: -0.825,0.125 -1.075,0.125 -1.025,0.13 -0.977,0.145 -0.935,0.168 -0.897,0.199 -0.866,0.238 -0.844,0.279 -0.83,0.326 -0.825,0.375
  circle w0: c-0.575,-0.86 r0.25
  circle w0: c0.575,-0.86 r0.25
  circle w0: c-0.575,-1.43 r0.25
  circle w0: c0.575,-1.43 r0.25
  region: 0.825,-1.43 -0.825,-1.43 -0.825,-0.86 0.825,-0.86
  region: 1.75,-1.125 0.825,-1.125 0.825,-0.875 1.75,-0.875
F.CrtYd:
  lines w0.05: -2,-2.25 2,-2.25 2,2.25 -2,2.25 -2,-2.25
F.Fab:
  lines w0.1: -1.5,-2 -1.5,1 -0.5,2 1.5,2 1.5,-2 -1.5,-2
  text "'.Designator'" at -2.828,-0.583 h0.7

## Linear_UGK52_QFN-46-52 [mm]
pads (62):
  rect 0.7x0.25 smd: 1(-3.4,3.25) 2(-3.4,2.75) 4(-3.4,1.75) 5(-3.4,1.25) 6(-3.4,0.75) 7(-3.4,0.25) 8(-3.4,-0.25) 9(-3.4,-0.75) 10(-3.4,-1.25) 11(-3.4,-1.75) 12(-3.4,-2.25) 13(-3.4,-2.75) 14(-3.4,-3.25) 27(3.4,-3.25) 28(3.4,-2.75) 29(3.4,-2.25) 30(3.4,-1.75) 31(3.4,-1.25) 32(3.4,-0.75) 33(3.4,-0.25) 34(3.4,0.25) 35(3.4,0.75) 36(3.4,1.25) 38(3.4,2.25) 39(3.4,2.75) 40(3.4,3.25)
  rect 0.25x0.7 smd: 15(-2.75,-3.9) 16(-2.25,-3.9) 17(-1.75,-3.9) 18(-1.25,-3.9) 19(-0.75,-3.9) 20(-0.25,-3.9) 21(0.25,-3.9) 22(0.75,-3.9) 23(1.25,-3.9) 24(1.75,-3.9) 25(2.25,-3.9) 26(2.75,-3.9) 42(2.25,3.9) 43(1.75,3.9) 44(1.25,3.9) 46(0.25,3.9) 47(-0.25,3.9) 48(-0.75,3.9) 50(-1.75,3.9) 52(-2.75,3.9)
  rect 1.352x1.613 smd: 53(-2.029,-2.419) 53(-2.029,-0.806) 53(-2.029,0.806) 53(-2.029,2.419) 53(-0.676,-2.419) 53(-0.676,-0.806) 53(-0.676,0.806) 53(-0.676,2.419) 53(0.676,-2.419) 53(0.676,-0.806) 53(0.676,0.806) 53(0.676,2.419) 53(2.029,-2.419) 53(2.029,-0.806) 53(2.029,0.806) 53(2.029,2.419)
F.SilkS:
  lines w0.15: -3.625,-3.6 -3.625,-4.125 -3.1,-4.125 ; -3.625,4.125 -3.1,4.125 ; 3.1,-4.125 3.625,-4.125 3.625,-3.6 ; 3.1,4.125 3.625,4.125 3.625,3.6
F.CrtYd:
  lines w0.05: -4,-4.5 -4,4.5 4,4.5 4,-4.5 -4,-4.5
F.Fab:
  lines w0.15: -3.5,-4 3.5,-4 3.5,4 -2.5,4 -3.5,3 -3.5,-4
  text "'.Designator'" at -4.047,-0.84 h1